# Altium footprint library PcbLib1.PcbLib: 51 footprints (part 3 of 4)
Each footprint in its own frame and in the unit in brackets; x right, y up, seen from the top. Pads: shape width x height; smd on the part's side, far side on the other; paste and mask are expansions set on the pad; w line width, h text height; cw(c..) or ccw(c..) is an arc to the next point about the centre after c.
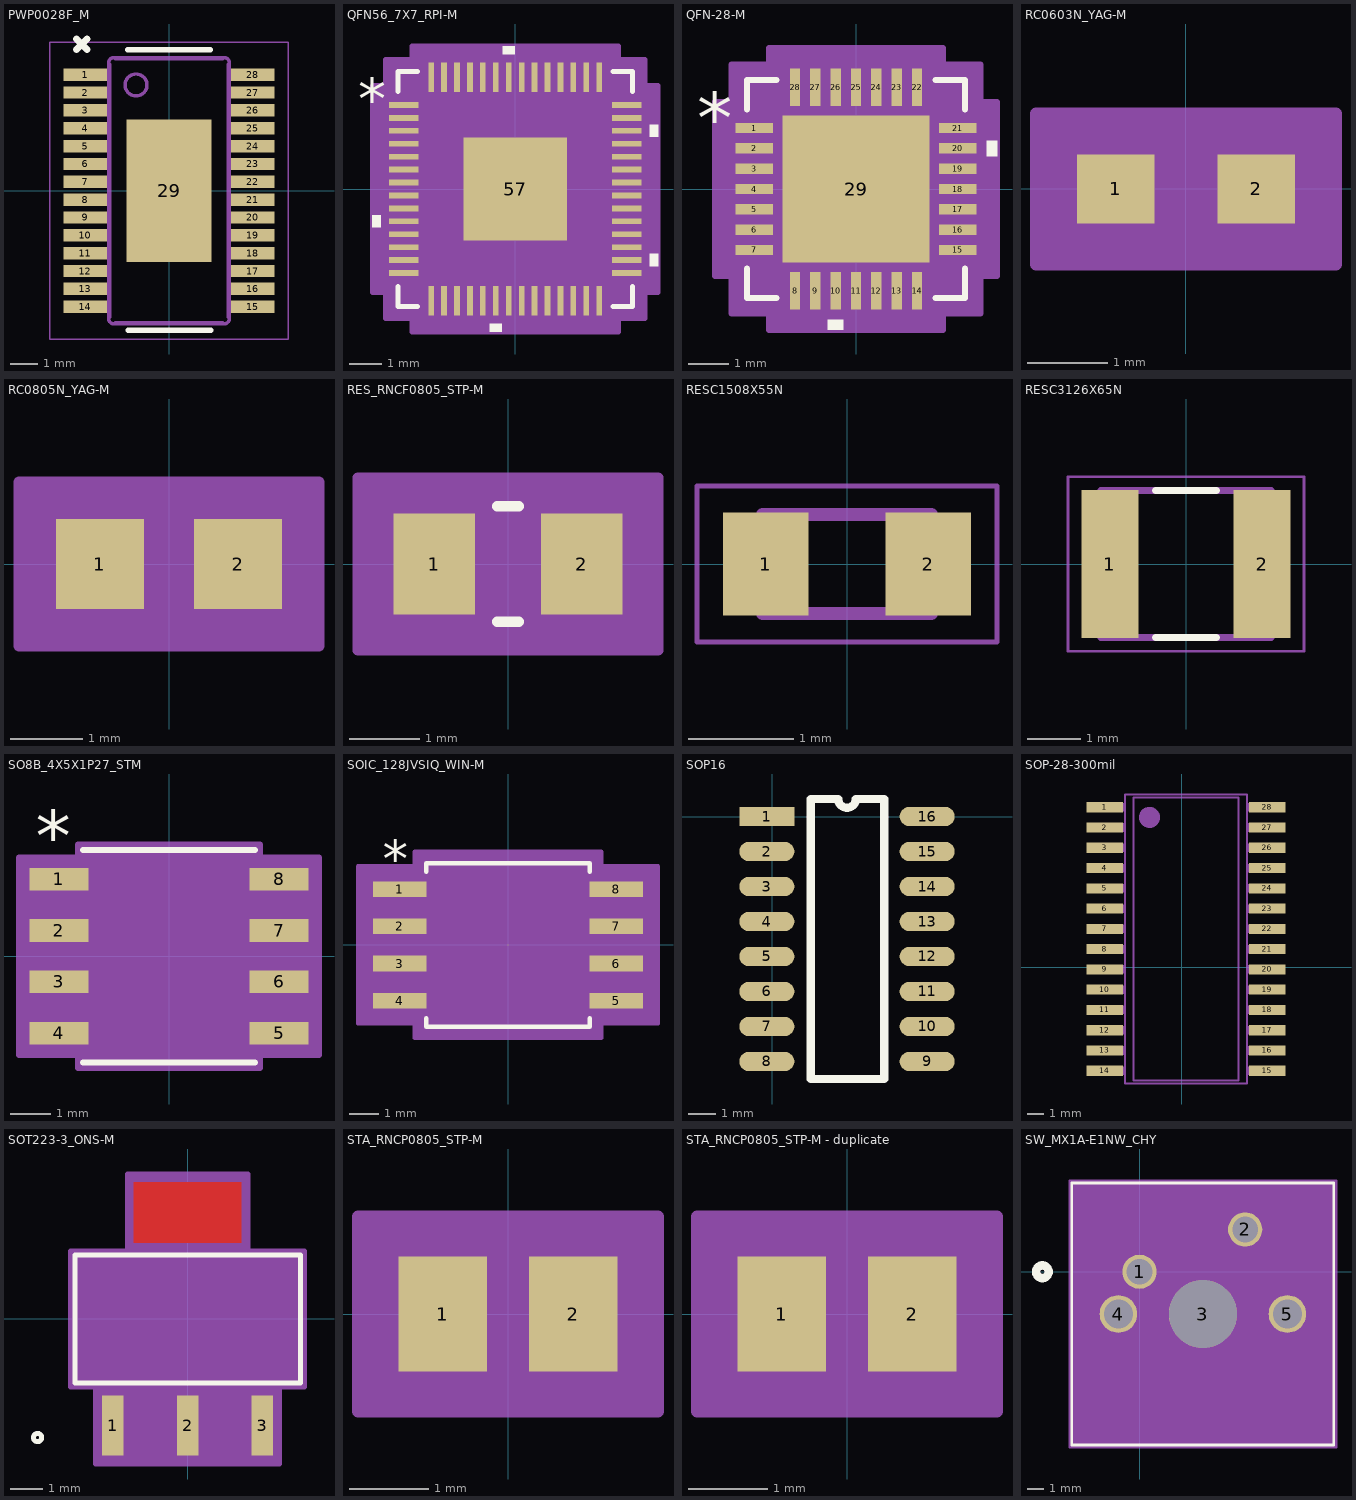
[diagram p2: the footprints below, top view; thin cyan lines are the x and y axes]

## PWP0028F_M [mm]
pads (29):
  rect 1.6x0.45 smd paste+0 mask+0.051: 1(-3.05,4.225) 2(-3.05,3.575) 3(-3.05,2.925) 4(-3.05,2.275) 5(-3.05,1.625) 6(-3.05,0.975) 7(-3.05,0.325) 8(-3.05,-0.325) 9(-3.05,-0.975) 10(-3.05,-1.625) 11(-3.05,-2.275) 12(-3.05,-2.925) 13(-3.05,-3.575) 14(-3.05,-4.225) 15(3.05,-4.225) 16(3.05,-3.575) 17(3.05,-2.925) 18(3.05,-2.275) 19(3.05,-1.625) 20(3.05,-0.975) 21(3.05,-0.325) 22(3.05,0.325) 23(3.05,0.975) 24(3.05,1.625) 25(3.05,2.275) 26(3.05,2.925) 27(3.05,3.575) 28(3.05,4.225)
  rect 3.1x5.18 smd paste+0 mask+0.051: 29(0,0)
Top Overlay:
  lines w0.2: -1.5,5.133 1.5,5.133 ; -1.476,-5.08 1.524,-5.08
  lines w0.254: -3.365,5.143 -2.984,5.524 ; -3.365,5.524 -2.984,5.143
Mechanical 13:
  drawing of 350 lines, arcs and shapes, not listed
Mechanical 15:
  lines w0.05: -4.35,-5.4 -4.35,5.4 4.35,5.4 4.35,-5.4 -4.35,-5.4
  lines w0.1: -0.5,0 0.5,0 ; 0,-0.5 0,0.5
3D body "PWP0028C.stp": height 1.13, standoff 0, extent -3.2,-4.85 3.2,4.85

## QFN56_7X7_RPI-M [mil]
pads (57):
  rect 36x7 smd paste+0 mask+0: 1(-136,102.36) 2(-136,86.61) 3(-136,70.87) 4(-136,55.12) 5(-136,39.37) 6(-136,23.62) 7(-136,7.87) 8(-136,-7.87) 9(-136,-23.62) 10(-136,-39.37) 11(-136,-55.12) 12(-136,-70.87) 13(-136,-86.61) 14(-136,-102.36) 29(136,-102.36) 30(136,-86.61) 31(136,-70.87) 32(136,-55.12) 33(136,-39.37) 34(136,-23.62) 35(136,-7.87) 36(136,7.87) 37(136,23.62) 38(136,39.37) 39(136,55.12) 40(136,70.87) 41(136,86.61) 42(136,102.36)
  rect 7x36 smd paste+0 mask+0: 15(-102.36,-136) 16(-86.61,-136) 17(-70.87,-136) 18(-55.12,-136) 19(-39.37,-136) 20(-23.62,-136) 21(-7.87,-136) 22(7.87,-136) 23(23.62,-136) 24(39.37,-136) 25(55.12,-136) 26(70.87,-136) 27(86.61,-136) 28(102.36,-136) 43(102.36,136) 44(86.61,136) 45(70.87,136) 46(55.12,136) 47(39.37,136) 48(23.62,136) 49(7.87,136) 50(-7.87,136) 51(-23.62,136) 52(-39.37,136) 53(-55.12,136) 54(-70.87,136) 55(-86.61,136) 56(-102.36,136)
  rect 126x126 smd paste-63 mask+0: 57(0,0)
Top Overlay:
  region: -0.37,164 -15.37,164 -15.37,174 -0.37,174
  region: 164,78.37 174,78.37 174,63.37 164,63.37
  region: 164,-79.11 174,-79.11 174,-94.11 164,-94.11
  region: -16.12,-164 -31.12,-164 -31.12,-174 -16.12,-174
  region: -164,-31.87 -174,-31.87 -174,-46.87 -164,-46.87
  lines w6: -143,-118.96 -143,-143 -118.96,-143 ; -143,118.96 -143,143 -118.96,143 ; 118.96,-143 143,-143 143,-118.96 ; 118.96,143 143,143 143,118.96
  text "*" at -191.5,85.24 h50
Top Paste:
  region: 59.06,-3.94 3.94,-3.94 3.94,-59.06 59.06,-59.06
  region: 59.06,59.06 3.94,59.06 3.94,3.94 59.06,3.94
  region: -3.94,-3.94 -59.06,-3.94 -59.06,-59.06 -3.94,-59.06
  region: -3.94,59.06 -59.06,59.06 -59.06,3.94 -3.94,3.94
Mechanical 13:
  lines w1: -138,88 -88,138 ; -138,-138 -138,138 138,138 138,-138 -138,-138 ; -138,-106.86 -138,-97.86 -138,-106.86 ; -138,-91.11 -138,-82.11 -138,-91.11 ; -138,-75.37 -138,-66.37 -138,-75.37 ; -138,-59.62 -138,-50.62 -138,-59.62 ; -138,-43.87 -138,-34.87 -138,-43.87 ; -138,-28.12 -138,-19.12 -138,-28.12 ; -138,-12.37 -138,-3.37 -138,-12.37 ; -138,3.37 -138,12.37 -138,3.37 ; -138,19.12 -138,28.12 -138,19.12 ; -138,34.87 -138,43.87 -138,34.87 ; -138,50.62 -138,59.62 -138,50.62 ; -138,66.37 -138,75.37 -138,66.37 ; -138,82.11 -138,91.11 -138,82.11 ; -138,97.86 -138,106.86 -138,97.86 ; -106.86,-138 -97.86,-138 -106.86,-138 ; -106.86,138 -97.86,138 -106.86,138 ; -91.11,-138 -82.11,-138 -91.11,-138 ; -91.11,138 -82.11,138 -91.11,138 ; -75.37,-138 -66.37,-138 -75.37,-138 ; -75.37,138 -66.37,138 -75.37,138 ; -59.62,-138 -50.62,-138 -59.62,-138 ; -59.62,138 -50.62,138 -59.62,138 ; -43.87,-138 -34.87,-138 -43.87,-138 ; -43.87,138 -34.87,138 -43.87,138 ; -28.12,-138 -19.12,-138 -28.12,-138 ; -28.12,138 -19.12,138 -28.12,138 ; -12.37,-138 -3.37,-138 -12.37,-138 ; -12.37,138 -3.37,138 -12.37,138 ; 3.37,-138 12.37,-138 3.37,-138 ; 3.37,138 12.37,138 3.37,138 ; 19.12,-138 28.12,-138 19.12,-138 ; 19.12,138 28.12,138 19.12,138 ; 34.87,-138 43.87,-138 34.87,-138 ; 34.87,138 43.87,138 34.87,138 ; 50.62,-138 59.62,-138 50.62,-138 ; 50.62,138 59.62,138 50.62,138 ; 66.37,-138 75.37,-138 66.37,-138 ; 66.37,138 75.37,138 66.37,138 ; 82.11,-138 91.11,-138 82.11,-138 ; 82.11,138 91.11,138 82.11,138 ; 97.86,-138 106.86,-138 97.86,-138 ; 97.86,138 106.86,138 97.86,138 ; 138,-106.86 138,-97.86 138,-106.86 ; 138,-91.11 138,-82.11 138,-91.11 ; 138,-75.37 138,-66.37 138,-75.37 ; 138,-59.62 138,-50.62 138,-59.62 ; 138,-43.87 138,-34.87 138,-43.87 ; 138,-28.12 138,-19.12 138,-28.12 ; 138,-12.37 138,-3.37 138,-12.37 ; 138,3.37 138,12.37 138,3.37 ; 138,19.12 138,28.12 138,19.12 ; 138,34.87 138,43.87 138,34.87 ; 138,50.62 138,59.62 138,50.62 ; 138,66.37 138,75.37 138,66.37 ; 138,82.11 138,91.11 138,82.11 ; 138,97.86 138,106.86 138,97.86
  text "*" at -130.5,85.24 h50
Mechanical 15:
  region: -125.86,-158 -158,-158 -158,-125.86 -174,-125.86 -174,125.86 -158,125.86 -158,158 -125.86,158 -125.86,174 125.86,174 125.86,158 158,158 158,125.86 174,125.86 174,-125.86 158,-125.86 158,-158 125.86,-158 125.86,-174 -125.86,-174
  lines w6: -174,-125.86 -174,125.86 -158,125.86 -158,158 -125.86,158 -125.86,174 125.86,174 125.86,158 158,158 158,125.86 174,125.86 174,-125.86 158,-125.86 158,-158 125.86,-158 125.86,-174 -125.86,-174 -125.86,-158 -158,-158 -158,-125.86 -174,-125.86
3D body "QFN56_7X7_RPI.step": height 35.12, standoff 0, extent -137.99,-137.99 137.99,137.99

## QFN-28-M [mil]
pads (29):
  rect 36x10 smd paste+0 mask+0: 1(-98.5,59.06) 2(-98.5,39.37) 3(-98.5,19.68) 4(-98.5,0) 5(-98.5,-19.68) 6(-98.5,-39.37) 7(-98.5,-59.06) 15(98.5,-59.06) 16(98.5,-39.37) 17(98.5,-19.68) 18(98.5,0) 19(98.5,19.68) 20(98.5,39.37) 21(98.5,59.06)
  rect 10x36 smd paste+0 mask+0: 8(-59.06,-98.5) 9(-39.37,-98.5) 10(-19.68,-98.5) 11(0,-98.5) 12(19.68,-98.5) 13(39.37,-98.5) 14(59.06,-98.5) 22(59.06,98.5) 23(39.37,98.5) 24(19.68,98.5) 25(0,98.5) 26(-19.68,98.5) 27(-39.37,98.5) 28(-59.06,98.5)
  rect 142x142 smd paste-71 mask+0: 29(0,0)
Top Overlay:
  region: -12.19,-126.5 -27.18,-126.5 -27.18,-136.5 -12.19,-136.5
  region: 126.5,46.87 136.5,46.87 136.5,31.87 126.5,31.87
  lines w6: -105.5,-77.16 -105.5,-105.5 -77.16,-105.5 ; -105.5,77.16 -105.5,105.5 -77.16,105.5 ; 77.16,-105.5 105.5,-105.5 105.5,-77.16 ; 77.16,105.5 105.5,105.5 105.5,77.16
  text "*" at -154,43.9 h50
Top Paste:
  region: -3.94,67.06 -67.06,67.06 -67.06,3.94 -3.94,3.94
  region: -3.94,-3.94 -67.06,-3.94 -67.06,-67.06 -3.94,-67.06
  region: 67.06,67.06 3.94,67.06 3.94,3.94 67.06,3.94
  region: 67.06,-3.94 3.94,-3.94 3.94,-67.06 67.06,-67.06
Mechanical 13:
  lines w1: -100.5,50.5 -50.5,100.5 ; -100.5,-100.5 100.5,-100.5 100.5,100.5 -100.5,100.5 -100.5,-100.5 ; -100.5,-65.06 -100.5,-53.06 -100.5,-65.06 ; -100.5,-45.37 -100.5,-33.37 -100.5,-45.37 ; -100.5,-25.68 -100.5,-13.69 -100.5,-25.68 ; -100.5,-6 -100.5,6 -100.5,-6 ; -100.5,13.69 -100.5,25.68 -100.5,13.69 ; -100.5,33.37 -100.5,45.37 -100.5,33.37 ; -100.5,53.06 -100.5,65.06 -100.5,53.06 ; -65.06,-100.5 -53.06,-100.5 -65.06,-100.5 ; -65.06,100.5 -53.06,100.5 -65.06,100.5 ; -45.37,-100.5 -33.37,-100.5 -45.37,-100.5 ; -45.37,100.5 -33.37,100.5 -45.37,100.5 ; -25.68,-100.5 -13.69,-100.5 -25.68,-100.5 ; -25.68,100.5 -13.69,100.5 -25.68,100.5 ; -6,-100.5 6,-100.5 -6,-100.5 ; -6,100.5 6,100.5 -6,100.5 ; 13.69,-100.5 25.68,-100.5 13.69,-100.5 ; 13.69,100.5 25.68,100.5 13.69,100.5 ; 33.37,-100.5 45.37,-100.5 33.37,-100.5 ; 33.37,100.5 45.37,100.5 33.37,100.5 ; 53.06,-100.5 65.06,-100.5 53.06,-100.5 ; 53.06,100.5 65.06,100.5 53.06,100.5 ; 100.5,-65.06 100.5,-53.06 100.5,-65.06 ; 100.5,-45.37 100.5,-33.37 100.5,-45.37 ; 100.5,-25.68 100.5,-13.69 100.5,-25.68 ; 100.5,-6 100.5,6 100.5,-6 ; 100.5,13.69 100.5,25.68 100.5,13.69 ; 100.5,33.37 100.5,45.37 100.5,33.37 ; 100.5,53.06 100.5,65.06 100.5,53.06
  text "*" at -93,43.9 h50
Mechanical 15:
  region: -84.06,-120.5 -120.5,-120.5 -120.5,-84.06 -136.5,-84.06 -136.5,84.06 -120.5,84.06 -120.5,120.5 -84.06,120.5 -84.06,136.5 84.06,136.5 84.06,120.5 120.5,120.5 120.5,84.06 136.5,84.06 136.5,-84.06 120.5,-84.06 120.5,-120.5 84.06,-120.5 84.06,-136.5 -84.06,-136.5
  lines w6: -136.5,-84.06 -120.5,-84.06 -120.5,-120.5 -84.06,-120.5 -84.06,-136.5 84.06,-136.5 84.06,-120.5 120.5,-120.5 120.5,-84.06 136.5,-84.06 136.5,84.06 120.5,84.06 120.5,120.5 84.06,120.5 84.06,136.5 -84.06,136.5 -84.06,120.5 -120.5,120.5 -120.5,84.06 -136.5,84.06 -136.5,-84.06
3D body "QFN-28.step": height 32.09, standoff 0, extent -100.51,-100.51 100.51,100.51

## RC0603N_YAG-M [mil]
pads (2):
  rect 38x34 smd paste+0 mask+0: 1(-34.5,0) 2(34.5,0)
Mechanical 13:
  lines w1: -31.5,-16 -31.5,16 ; -31.5,-16 -15.5,-16 -15.5,16 -31.5,16 ; -31.5,-16 31.5,-16 ; -31.5,-16 -31.5,16 ; -31.5,16 31.5,16 ; 31.5,-16 15.5,-16 15.5,16 31.5,16 ; 31.5,-16 31.5,16 ; 31.5,-16 31.5,16
Mechanical 15:
  region: 73.5,-37 -73.5,-37 -73.5,37 73.5,37
  lines w6: -73.5,-37 -73.5,37 73.5,37 73.5,-37 -73.5,-37
3D body "RC0603N_YAG.step": height 27.99, standoff 0, extent -31.5,-15.98 31.5,15.98

## RC0805N_YAG-M [mil]
pads (2):
  rect 48x49 smd paste+0 mask+0: 1(-37.5,0) 2(37.5,0)
Mechanical 13:
  lines w1: -39.5,-23.5 -39.5,23.5 ; -39.5,-23.5 -13.5,-23.5 -13.5,23.5 -39.5,23.5 ; -39.5,-23.5 39.5,-23.5 ; -39.5,-23.5 -39.5,23.5 ; -39.5,23.5 39.5,23.5 ; 39.5,-23.5 13.5,-23.5 13.5,23.5 39.5,23.5 ; 39.5,-23.5 39.5,23.5 ; 39.5,-23.5 39.5,23.5
Mechanical 15:
  region: 81.5,-44.5 -81.5,-44.5 -81.5,44.5 81.5,44.5
  lines w6: -81.5,-44.5 -81.5,44.5 81.5,44.5 81.5,-44.5 -81.5,-44.5
3D body "RC0805N_YAG.step": height 27.99, standoff 0, extent -39.49,-23.5 39.49,23.5

## RES_RNCF0805_STP-M [mil]
pads (2):
  rect 46x57 smd paste+0 mask+0: 1(-41.5,0) 2(41.5,0)
Top Overlay:
  lines w6: -6.03,-32.5 6.03,-32.5 ; -6.03,32.5 6.03,32.5
Mechanical 13:
  lines w1: -42.5,-27.5 -42.5,27.5 ; -42.5,-27.5 42.5,-27.5 ; -42.5,-27.5 -18.5,-27.5 -18.5,27.5 -42.5,27.5 ; -42.5,-27.5 -42.5,27.5 ; -42.5,27.5 42.5,27.5 ; 42.5,-27.5 42.5,27.5 ; 42.5,-27.5 42.5,27.5 ; 42.5,-27.5 18.5,-27.5 18.5,27.5 42.5,27.5
Mechanical 15:
  region: 84.5,-48.5 -84.5,-48.5 -84.5,48.5 84.5,48.5
  lines w6: -84.5,-48.5 84.5,-48.5 84.5,48.5 -84.5,48.5 -84.5,-48.5
3D body "RES_RNCF0805_STP.step": height 25.98, standoff 0, extent -42.52,-27.48 42.52,27.48

## RESC1508X55N [mm]
pads (2):
  rect 0.81x0.98 smd: 1(-0.771,0) 2(0.771,0)
Mechanical 13:
  lines w0.127: -0.8,-0.47 0.8,-0.47 0.8,0.47 -0.8,0.47 -0.8,-0.47
Mechanical 15:
  lines w0.05: -1.425,-0.74 1.425,-0.74 1.425,0.74 -1.425,0.74 -1.425,-0.74
3D body "MCT 0603.stp": height 0.45, standoff 0, extent -0.775,-0.406 0.775,0.444

## RESC3126X65N [mm]
pads (2):
  rect 1.07x2.77 smd: 1(-1.43,0) 2(1.43,0)
Top Overlay:
  lines w0.127: -0.57,-1.38 0.57,-1.38 ; -0.57,1.38 0.57,1.38
Mechanical 13:
  lines w0.127: -1.6,-1.38 1.6,-1.38 1.6,1.38 -1.6,1.38 -1.6,-1.38
Mechanical 15:
  lines w0.05: -2.215,-1.635 2.215,-1.635 2.215,1.635 -2.215,1.635 -2.215,-1.635
3D body "step_temp.STEP": height 0.65, standoff 0, extent -1.55,-1.3 1.55,1.3

## SO8B_4X5X1P27_STM [mil]
pads (8):
  rect 57.5x22 smd paste+0 mask+0: 1(-107.25,75) 2(-107.25,25) 3(-107.25,-25) 4(-107.25,-75) 5(107.25,-75) 6(107.25,-25) 7(107.25,25) 8(107.25,75)
Top Overlay:
  lines w6: -83.5,-103.5 83.5,-103.5 ; -83.5,103.5 83.5,103.5
  text "*" at -129.75,92 h50
Mechanical 13:
  lines w0: -12,98.5 ccw(c0,98.5) 12,98.5
  lines w1: -122,-85 -78.5,-85 -78.5,-65 -122,-65 -122,-85 ; -122,-35 -78.5,-35 -78.5,-15 -122,-15 -122,-35 ; -122,15 -78.5,15 -78.5,35 -122,35 -122,15 ; -122,65 -78.5,65 -78.5,85 -122,85 -122,65 ; -78.5,-98.5 -78.5,98.5 78.5,98.5 78.5,-98.5 -78.5,-98.5 ; 78.5,-85 122,-85 122,-65 78.5,-65 78.5,-85 ; 78.5,-35 122,-35 122,-15 78.5,-15 78.5,-35 ; 78.5,15 122,15 122,35 78.5,35 78.5,15 ; 78.5,65 122,65 122,85 78.5,85 78.5,65
  text "*" at -76,45.5 h50
Mechanical 15:
  region: -88.5,-96 -146,-96 -146,96 -88.5,96 -88.5,108.5 88.5,108.5 88.5,96 146,96 146,-96 88.5,-96 88.5,-108.5 -88.5,-108.5
  lines w6: -146,-96 -88.5,-96 -88.5,-108.5 88.5,-108.5 88.5,-96 146,-96 146,96 88.5,96 88.5,108.5 -88.5,108.5 -88.5,96 -146,96 -146,-96
3D body "SO8B_4X5X1P27_STM.step": height 69.09, standoff 0, extent -122.01,-98.5 122.01,98.5

## SOIC_128JVSIQ_WIN-M [mil]
pads (8):
  rect 72x21 smd paste+0 mask+0: 1(-145.5,75) 2(-145.5,25) 3(-145.5,-25) 4(-145.5,-75) 5(145.5,-75) 6(145.5,-25) 7(145.5,25) 8(145.5,75)
Top Overlay:
  lines w6: -110,-98.6 -110,-110 110,-110 110,-98.6 ; -110,98.6 -110,110 110,110 110,98.6
  text "*" at -168,91 h50
Mechanical 13:
  lines w0: -12,105 ccw(c0,105) 12,105
  lines w1: -159.5,-84.5 -105,-84.5 -105,-65.5 -159.5,-65.5 -159.5,-84.5 ; -159.5,-34.5 -105,-34.5 -105,-15.5 -159.5,-15.5 -159.5,-34.5 ; -159.5,15.5 -105,15.5 -105,34.5 -159.5,34.5 -159.5,15.5 ; -159.5,65.5 -105,65.5 -105,84.5 -159.5,84.5 -159.5,65.5 ; -105,-105 -105,105 105,105 105,-105 -105,-105 ; 105,-84.5 159.5,-84.5 159.5,-65.5 105,-65.5 105,-84.5 ; 105,-34.5 159.5,-34.5 159.5,-15.5 105,-15.5 105,-34.5 ; 105,15.5 159.5,15.5 159.5,34.5 105,34.5 105,15.5 ; 105,65.5 159.5,65.5 159.5,84.5 105,84.5 105,65.5
  text "*" at -102.5,52 h50
Mechanical 15:
  region: -125,-105.5 -201.5,-105.5 -201.5,105.5 -125,105.5 -125,125 125,125 125,105.5 201.5,105.5 201.5,-105.5 125,-105.5 125,-125 -125,-125
  lines w6: -201.5,-105.5 -125,-105.5 -125,-125 125,-125 125,-105.5 201.5,-105.5 201.5,105.5 125,105.5 125,125 -125,125 -125,105.5 -201.5,105.5 -201.5,-105.5
3D body "SOIC_128JVSIQ_WIN.step": height 85.12, standoff 0, extent -159.49,-105 159.49,105

## SOP16 [mm]
pads (16):
  rect 2x0.7 smd: 1(-0.2,0)
  oval 2x0.7 smd: 2(-0.2,-1.27) 3(-0.2,-2.54) 4(-0.2,-3.81) 5(-0.2,-5.08) 6(-0.2,-6.35) 7(-0.2,-7.62) 8(-0.2,-8.89) 9(5.62,-8.89) 10(5.62,-7.62) 11(5.62,-6.35) 12(5.62,-5.08) 13(5.62,-3.81) 14(5.62,-2.54) 15(5.62,-1.27) 16(5.62,0)
Top Overlay:
  lines w0.3: 1.397,-9.525 1.397,0.635 2.392,0.635 ccw(c2.71,0.635) 3.027,0.635 4.064,0.635 4.064,-9.525 1.397,-9.525
3D body "SL2.1A--3DModel-STEP-269445.STEP": height 1.85, standoff 0, extent -0.353,-9.395 5.687,0.505

## SOP-28-300mil [mil]
pads (28):
  rect 90x25 smd: 1(-190,395) 2(-190,345) 3(-190,295) 4(-190,245) 5(-190,195) 6(-190,145) 7(-190,95) 8(-190,45) 9(-190,-5) 10(-190,-55) 11(-190,-105) 12(-190,-155) 13(-190,-205) 14(-190,-255) 15(210,-255) 16(210,-205) 17(210,-155) 18(210,-105) 19(210,-55) 20(210,-5) 21(210,45) 22(210,95) 23(210,145) 24(210,195) 25(210,245) 26(210,295) 27(210,345) 28(210,395)
Mechanical 3:
  region: -210,405 -142.5,405 -142.5,385 -210,385
  region: -210,355 -142.5,355 -142.5,335 -210,335
  region: -210,305 -142.5,305 -142.5,285 -210,285
  region: -210,255 -142.5,255 -142.5,235 -210,235
  region: -210,205 -142.5,205 -142.5,185 -210,185
  region: -210,155 -142.5,155 -142.5,135 -210,135
  region: -210,105 -142.5,105 -142.5,85 -210,85
  region: -210,55 -142.5,55 -142.5,35 -210,35
  region: -210,5 -142.5,5 -142.5,-15 -210,-15
  region: -210,-45 -142.5,-45 -142.5,-65 -210,-65
  region: -210,-95 -142.5,-95 -142.5,-115 -210,-115
  region: -210,-145 -142.5,-145 -142.5,-165 -210,-165
  region: -210,-195 -142.5,-195 -142.5,-215 -210,-215
  region: -210,-245 -142.5,-245 -142.5,-265 -210,-265
  region: 230,-265 162.5,-265 162.5,-245 230,-245
  region: 230,-215 162.5,-215 162.5,-195 230,-195
  region: 230,-165 162.5,-165 162.5,-145 230,-145
  region: 230,-115 162.5,-115 162.5,-95 230,-95
  region: 230,-65 162.5,-65 162.5,-45 230,-45
  region: 230,-15 162.5,-15 162.5,5 230,5
  region: 230,35 162.5,35 162.5,55 230,55
  region: 230,85 162.5,85 162.5,105 230,105
  region: 230,135 162.5,135 162.5,155 230,155
  region: 230,185 162.5,185 162.5,205 230,205
  region: 230,235 162.5,235 162.5,255 230,255
  region: 230,285 162.5,285 162.5,305 230,305
  region: 230,335 162.5,335 162.5,355 230,355
  region: 230,385 162.5,385 162.5,405 230,405
  lines w5: -140,-286 160,-286 160,426 -140,426 -140,-286 ; -120,-279 140,-279 140,419 -120,419 -120,-279
Mechanical 7:
  circle w32: c-80,370 r10
  lines w5: -140,-286 160,-286 160,426 -140,426 -140,-286

## SOT223-3_ONS-M [mil]
pads (3):
  rect 26x73 smd paste+0 mask+0: 1(-90.5,-129) 2(0,-129) 3(90.5,-129)
Top Layer:
  region: 65,92.5 65,165.5 -65,165.5 -65,92.5
Top Overlay:
  circle w6: c-181.5,-143.5 r5
  lines w6: -136.5,-77.5 -136.5,77.5 136.5,77.5 136.5,-77.5 -136.5,-77.5
Top Paste:
  region: 65,92.5 65,165.5 -65,165.5 -65,92.5
Top Solder:
  region: 67,74.5 67,187.5 -67,187.5 -67,74.5
Mechanical 13:
  circle w0: c-121.5,-62.5 r5
  lines w1: -131.5,-72.5 -131.5,72.5 131.5,72.5 131.5,-72.5 -131.5,-72.5 ; -101.5,-143.5 -79.5,-143.5 -79.5,-72.5 -101.5,-72.5 -101.5,-143.5 ; -63,72.5 -63,143.5 63,143.5 63,72.5 -63,72.5 ; -11,-143.5 11,-143.5 11,-72.5 -11,-72.5 -11,-143.5 ; 79.5,-143.5 101.5,-143.5 101.5,-72.5 79.5,-72.5 79.5,-143.5
Mechanical 15:
  region: -141.5,-82.5 -141.5,82.5 -73,82.5 -73,175.5 73,175.5 73,82.5 141.5,82.5 141.5,-82.5 111.5,-82.5 111.5,-175.5 -111.5,-175.5 -111.5,-82.5
  lines w6: -141.5,-82.5 -111.5,-82.5 -111.5,-175.5 111.5,-175.5 111.5,-82.5 141.5,-82.5 141.5,82.5 73,82.5 73,175.5 -73,175.5 -73,82.5 -141.5,82.5 -141.5,-82.5
3D body "SOT223-3_ONS.step": height 68.11, standoff 0, extent -131.5,-143.5 131.5,143.5

## STA_RNCP0805_STP-M [mil]
pads (2):
  rect 44x57 smd paste+0 mask+0: 1(-32.5,0) 2(32.5,0)
Mechanical 13:
  lines w1: -42.5,-27.5 -42.5,27.5 ; -42.5,-27.5 -10.5,-27.5 -10.5,27.5 -42.5,27.5 ; -42.5,-27.5 42.5,-27.5 ; -42.5,-27.5 -42.5,27.5 ; -42.5,27.5 42.5,27.5 ; 42.5,-27.5 10.5,-27.5 10.5,27.5 42.5,27.5 ; 42.5,-27.5 42.5,27.5 ; 42.5,-27.5 42.5,27.5
Mechanical 15:
  region: 74.5,-48.5 -74.5,-48.5 -74.5,48.5 74.5,48.5
  lines w6: -74.5,-48.5 -74.5,48.5 74.5,48.5 74.5,-48.5 -74.5,-48.5
3D body "STA_RNCP0805_STP.step": height 24.02, standoff 0, extent -42.52,-27.48 42.52,27.48

## STA_RNCP0805_STP-M - duplicate [mil]
pads (2):
  rect 44x57 smd paste+0 mask+0: 1(-32.5,0) 2(32.5,0)
Mechanical 13:
  lines w1: -42.5,-27.5 -42.5,27.5 ; -42.5,-27.5 42.5,-27.5 ; -42.5,-27.5 -10.5,-27.5 -10.5,27.5 -42.5,27.5 ; -42.5,-27.5 -42.5,27.5 ; -42.5,27.5 42.5,27.5 ; 42.5,-27.5 42.5,27.5 ; 42.5,-27.5 42.5,27.5 ; 42.5,-27.5 10.5,-27.5 10.5,27.5 42.5,27.5
Mechanical 15:
  region: 74.5,-48.5 -74.5,-48.5 -74.5,48.5 74.5,48.5
  lines w6: -74.5,-48.5 74.5,-48.5 74.5,48.5 -74.5,48.5 -74.5,-48.5
3D body "STA_RNCP0805_STP.step": height 24.02, standoff 0, extent -42.52,-27.48 42.52,27.48

## SW_MX1A-E1NW_CHY [mil]
pads (5):
  round 81 / inner round 60 / far side round 81 hole 61 paste-99999 mask+0: 1(0,0) 2(250,100)
  round 161 / inner round 60 / far side round 161 hole 161 unplated paste-99999 mask-80.5: 3(150,-100)
  round 89 / inner round 60 / far side round 89 hole 69 paste-99999 mask-44.5: 4(-50,-100) 5(350,-100)
Top Overlay:
  circle w20: c-230,0 r15
  lines w6: -160,-410 -160,210 460,210 460,-410 -160,-410
Bottom Overlay:
  circle w20: c-230,0 r15
Mechanical 13:
  circle w20: c0,75 r15
  lines w1: -155,-405 -155,205 455,205 455,-405 -155,-405
Mechanical 15:
  region: 465,215 -165,215 -165,-415 465,-415
  lines w6: -165,-415 465,-415 465,215 -165,215 -165,-415
3D body "Kailh Polia.step": height 603.54, standoff -126.7, extent -124.61,-407.99 424.61,206.18